# Altium footprint library Mine.PcbLib: 306 footprints (part 1 of 20)
Each footprint in its own frame and in the unit in brackets; x right, y up, seen from the top. Pads: shape width x height; smd on the part's side, far side on the other; paste and mask are expansions set on the pad; w line width, h text height; cw(c..) or ccw(c..) is an arc to the next point about the centre after c.
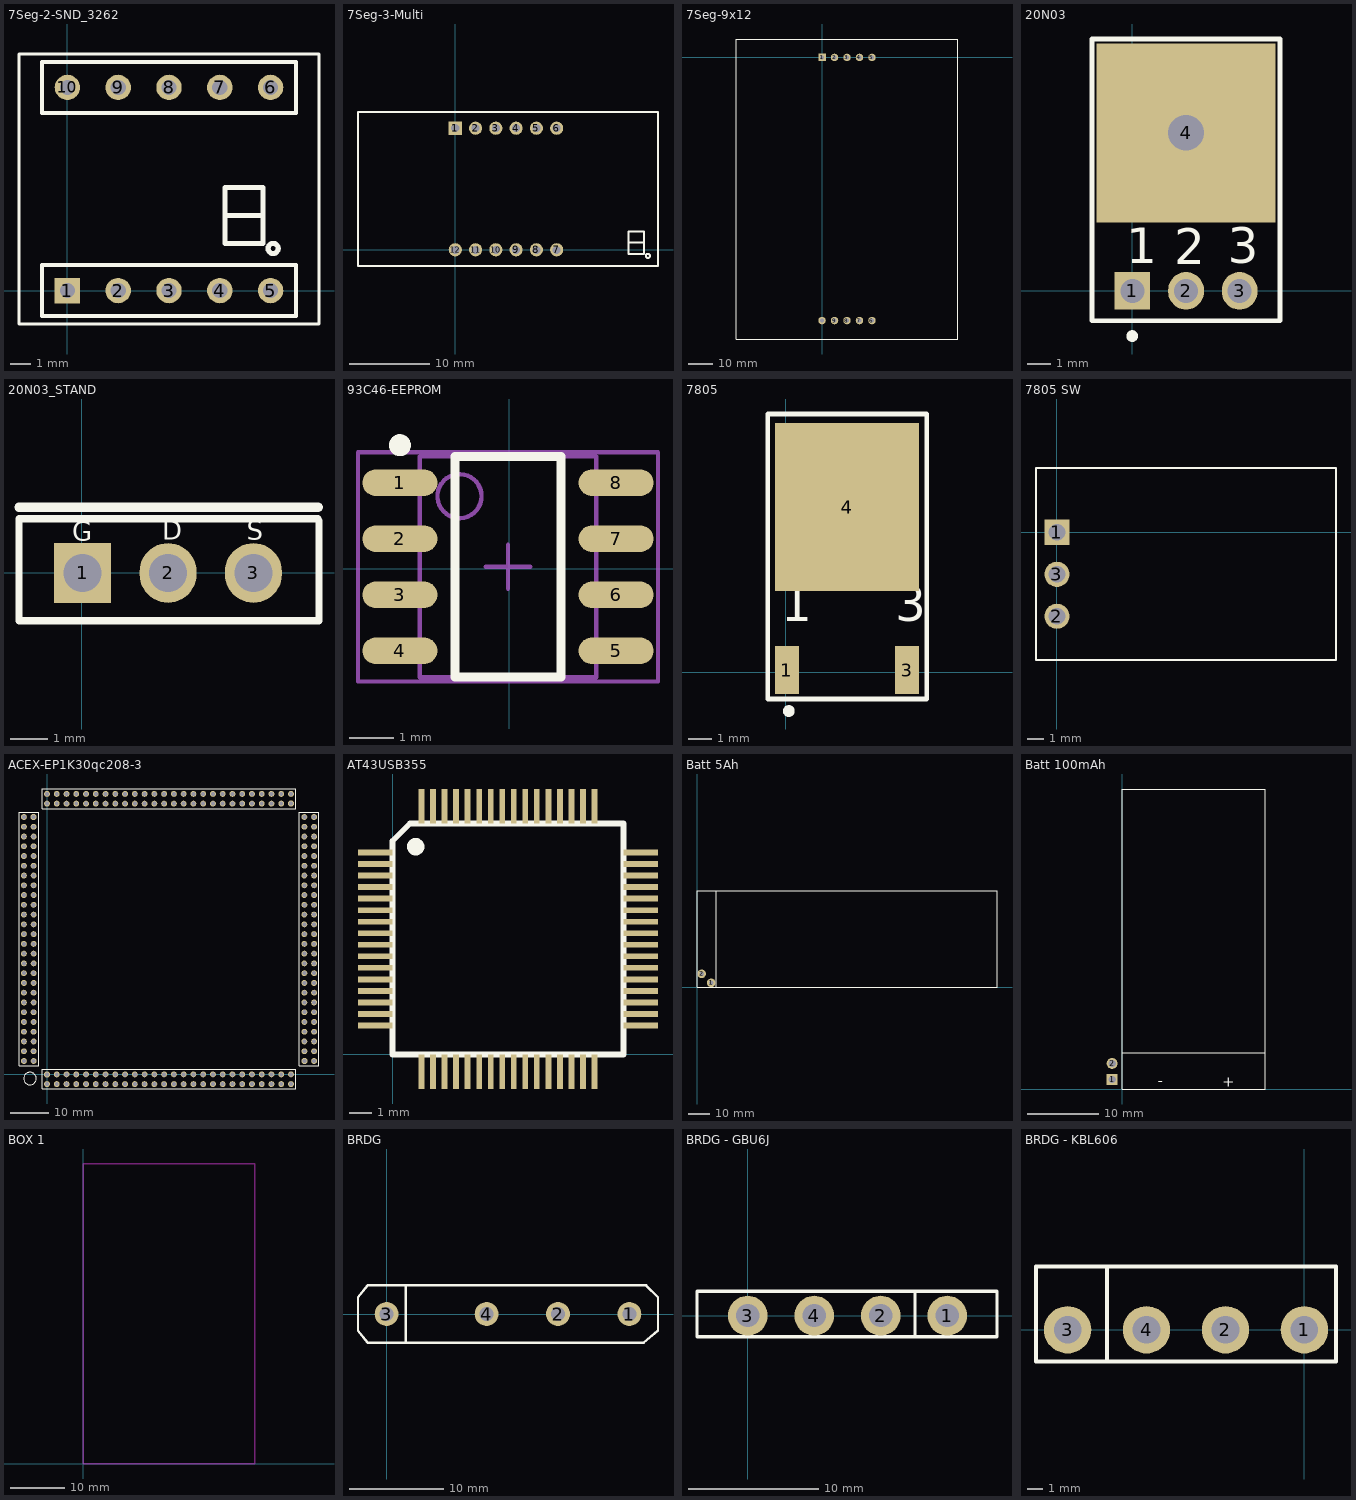
[diagram p0: the footprints below, top view; thin cyan lines are the x and y axes]

## 7Seg-2-SND_3262 [mil]
height 275.59
pads (10):
  rect 50x50 hole 30: 1(0,0)
  round 50 hole 30: 2(100,0) 3(200,0) 4(300,0) 5(400,0) 6(400,400) 7(300,400) 8(200,400) 9(100,400) 10(0,400)
Top Overlay:
  circle w10: c405,83 r10
  lines w5: -95.28,-65.75 -95.28,465.75 495.28,465.75 495.28,-65.75 -95.28,-65.75
  lines w7.87: -50,-50 450,-50 450,50 -50,50 -50,-50 ; -50,350 450,350 450,450 -50,450 -50,350
  lines w10: 310,148 380,148 ; 310,93 385,93 385,203 310,203 310,93

## 7Seg-3-Multi [mil]
height 393.7
pads (12):
  rect 65x65 hole 40: 1(0,600)
  round 65 hole 40: 2(100,600) 3(200,600) 4(300,600) 5(400,600) 6(500,600) 7(500,0) 8(400,0) 9(300,0) 10(200,0) 11(100,0) 12(0,0)
Top Overlay:
  circle w10: c950,-30 r10
  lines w10: 855,35 925,35 ; -480,-80 -480,680 1000,680 1000,-80 -480,-80 ; 855,-20 855,90 930,90 930,-20 855,-20
3D body: height 393.7, standoff 0, extent -480,-80 1000,680

## 7Seg-9x12 [mil]
height 590.55
pads (10):
  rect 120x120 hole 60: 1(0,0)
  round 120 hole 60: 2(200,0) 3(400,0) 4(600,0) 5(800,0) 6(800,-4212.6) 7(600,-4212.6) 8(400,-4212.6) 9(200,-4212.6) 10(0,-4212.6)
Top Overlay:
  lines w10: -1371.65,-4507.87 2171.65,-4507.87 2171.65,295.28 -1371.65,295.28 -1371.65,-4507.87

## 20N03 [mil]
height 275.59
pads (4):
  rect 60x62.99 hole 40: 1(0,0)
  oval 60x62.99 hole 40: 2(90,0) 3(179.92,0)
  rect 300x300 on Top hole 60: 4(90,265)
Top Overlay:
  circle w9.84: c-0.2,-75.79 r4.92
  lines w7.87: -67.52,-50.2 -67.52,422.24 247.44,422.24 247.44,-50.2 -67.52,-50.2
  text "1" at -10.04,46.26 h59.06
  text "3" at 160.35,46.26 h59.06
  text "2" at 70,45 h59.05

## 20N03_STAND [mil]
pads (3):
  rect 60x62.99 hole 40: 1(1,0)
  oval 60x62.99 hole 40: 2(91,0) 3(180.92,0)
Top Overlay:
  lines w7.87: -66,-50.2 -66,57 248.44,57 ; -65.52,-50.2 249.44,-50.2 ; 250,-50.2 250,55
  lines w10: -66,69 249,69
  text "G" at -10,34 h20
  text "S" at 174,35 h20
  text "D" at 85,35 h20

## 93C46-EEPROM [mm]
pads (8):
  oval 1.7x0.6 smd: 1(-2.475,1.956) 2(-2.475,0.686) 3(-2.475,-0.584) 4(-2.475,-1.854) 5(2.425,-1.854) 6(2.425,-0.584) 7(2.425,0.686) 8(2.425,1.956)
Top Overlay:
  circle w0.25: c-2.475,2.806 r0.125
  lines w0.2: -1.225,-2.449 1.175,-2.449 1.175,2.551 -1.225,2.551 -1.225,-2.449
Mechanical 13:
  circle w0.1: c-1.125,1.651 r0.5
  lines w0.1: -2.025,-2.449 1.975,-2.449 1.975,2.551 -2.025,2.551 -2.025,-2.449
Mechanical 15:
  lines w0.1: -0.525,0.051 0.475,0.051 ; -0.025,-0.449 -0.025,0.551 ; -3.425,-2.549 3.375,-2.549 3.375,2.651 -3.425,2.651 -3.425,-2.549
3D body: height 1.75, standoff 0, extent -2.025,-2.449 1.975,2.551

## 7805 [mil]
pads (3):
  rect 40x80 smd: 1(2,3.29) 3(202,3.29)
  rect 240x280 smd: 4(102,274.71)
Top Overlay:
  circle w9.84: c5.08,-65 r4.92
  lines w7.87: -30,-45 235,-45 235,430 -30,430 -30,-45
  text "1" at -7.84,84.98 h59.06
  text "3" at 182,84.98 h59.06

## 7805 SW [mil]
height 400
pads (3):
  rect 60x60 hole 40: 1(0,0)
  round 60 hole 40: 2(0,-200) 3(0,-100)
Top Overlay:
  lines w5: -50,-304 -50,153 665,153 665,-304 -50,-304

## ACEX-EP1K30qc208-3 [mil]
height 196.85
pads (208):
  oct 60x60 hole 40: 1(0,0) 53(2637.01,137.01) 105(2500,2774.02) 157(-137.01,2637.01)
  round 60 hole 40: 2(0,-100) 3(100,0) 4(100,-100) 5(200,0) 6(200,-100) 7(300,0) 8(300,-100) 9(400,0) 10(400,-100) 11(500,0) 12(500,-100) 13(600,0) 14(600,-100) 15(700,0) 16(700,-100) 17(800,0) 18(800,-100) 19(900,0) 20(900,-100) 21(1000,0) 22(1000,-100) 23(1100,0) 24(1100,-100) 25(1200,0) 26(1200,-100) 27(1300,0) 28(1300,-100) 29(1400,0) 30(1400,-100) 31(1500,0) 32(1500,-100) 33(1600,0) 34(1600,-100) 35(1700,0) 36(1700,-100) 37(1800,0) 38(1800,-100) 39(1900,0) 40(1900,-100) 41(2000,0) 42(2000,-100) 43(2100,0) 44(2100,-100) 45(2200,0) 46(2200,-100) 47(2300,0) 48(2300,-100) 49(2400,0) 50(2400,-100) 51(2500,0) 52(2500,-100) 54(2737.01,137.01) 55(2637.01,237.01) 56(2737.01,237.01) 57(2637.01,337.01) 58(2737.01,337.01) 59(2637.01,437.01) 60(2737.01,437.01) 61(2637.01,537.01) 62(2737.01,537.01) 63(2637.01,637.01) 64(2737.01,637.01) 65(2637.01,737.01) 66(2737.01,737.01) 67(2637.01,837.01) 68(2737.01,837.01) 69(2637.01,937.01) 70(2737.01,937.01) 71(2637.01,1037.01) 72(2737.01,1037.01) 73(2637.01,1137.01) 74(2737.01,1137.01) 75(2637.01,1237.01) 76(2737.01,1237.01) 77(2637.01,1337.01) 78(2737.01,1337.01) 79(2637.01,1437.01) 80(2737.01,1437.01) 81(2637.01,1537.01) 82(2737.01,1537.01) 83(2637.01,1637.01) 84(2737.01,1637.01) 85(2637.01,1737.01) 86(2737.01,1737.01) 87(2637.01,1837.01) 88(2737.01,1837.01) 89(2637.01,1937.01) 90(2737.01,1937.01) 91(2637.01,2037.01) 92(2737.01,2037.01) 93(2637.01,2137.01) 94(2737.01,2137.01) 95(2637.01,2237.01) 96(2737.01,2237.01) 97(2637.01,2337.01) 98(2737.01,2337.01) 99(2637.01,2437.01) 100(2737.01,2437.01) 101(2637.01,2537.01) 102(2737.01,2537.01) 103(2637.01,2637.01) 104(2737.01,2637.01) 106(2500,2874.02) 107(2400,2774.02) 108(2400,2874.02) 109(2300,2774.02) 110(2300,2874.02) 111(2200,2774.02) 112(2200,2874.02) 113(2100,2774.02) 114(2100,2874.02) 115(2000,2774.02) 116(2000,2874.02) 117(1900,2774.02) 118(1900,2874.02) 119(1800,2774.02) 120(1800,2874.02) 121(1700,2774.02) 122(1700,2874.02) 123(1600,2774.02) 124(1600,2874.02) 125(1500,2774.02) 126(1500,2874.02) 127(1400,2774.02) 128(1400,2874.02) 129(1300,2774.02) 130(1300,2874.02) 131(1200,2774.02) 132(1200,2874.02) 133(1100,2774.02) 134(1100,2874.02) 135(1000,2774.02) 136(1000,2874.02) 137(900,2774.02) 138(900,2874.02) 139(800,2774.02) 140(800,2874.02) 141(700,2774.02) 142(700,2874.02) 143(600,2774.02) 144(600,2874.02) 145(500,2774.02) 146(500,2874.02) 147(400,2774.02) 148(400,2874.02) 149(300,2774.02) 150(300,2874.02) 151(200,2774.02) 152(200,2874.02) 153(100,2774.02) 154(100,2874.02) 155(0,2774.02) 156(0,2874.02) 158(-237.01,2637.01) 159(-137.01,2537.01) 160(-237.01,2537.01) 161(-137.01,2437.01) 162(-237.01,2437.01) 163(-137.01,2337.01) 164(-237.01,2337.01) 165(-137.01,2237.01) 166(-237.01,2237.01) 167(-137.01,2137.01) 168(-237.01,2137.01) 169(-137.01,2037.01) 170(-237.01,2037.01) 171(-137.01,1937.01) 172(-237.01,1937.01) 173(-137.01,1837.01) 174(-237.01,1837.01) 175(-137.01,1737.01) 176(-237.01,1737.01) 177(-137.01,1637.01) 178(-237.01,1637.01) 179(-137.01,1537.01) 180(-237.01,1537.01) 181(-137.01,1437.01) 182(-237.01,1437.01) 183(-137.01,1337.01) 184(-237.01,1337.01) 185(-137.01,1237.01) 186(-237.01,1237.01) 187(-137.01,1137.01) 188(-237.01,1137.01) 189(-137.01,1037.01) 190(-237.01,1037.01) 191(-137.01,937.01) 192(-237.01,937.01) 193(-137.01,837.01) 194(-237.01,837.01) 195(-137.01,737.01) 196(-237.01,737.01) 197(-137.01,637.01) 198(-237.01,637.01) 199(-137.01,537.01) 200(-237.01,537.01) 201(-137.01,437.01) 202(-237.01,437.01) 203(-137.01,337.01) 204(-237.01,337.01) 205(-137.01,237.01) 206(-237.01,237.01) 207(-137.01,137.01) 208(-237.01,137.01)
Top Overlay:
  circle w10: c-174.61,-43 r64.46
  lines w7.87: -287.01,87.01 -287.01,2687.01 -87.01,2687.01 -87.01,87.01 -287.01,87.01 ; -50,-150 2550,-150 2550,50 -50,50 -50,-150 ; -50,2724.02 -50,2924.02 2550,2924.02 2550,2724.02 -50,2724.02 ; 2587.01,87.01 2787.01,87.01 2787.01,2687.01 2587.01,2687.01 2587.01,87.01

## AT43USB355 [mil]
pads (64):
  rect 60x10 smd: 1(-30,350) 2(-30,330) 3(-30,310) 4(-30,290) 5(-30,270) 6(-30,250) 7(-30,230) 8(-30,210) 9(-30,190) 10(-30,170) 11(-30,150) 12(-30,130) 13(-30,110) 14(-30,90) 15(-30,70) 16(-30,50) 33(430,50) 34(430,70) 35(430,90) 36(430,110) 37(430,130) 38(430,150) 39(430,170) 40(430,190) 41(430,210) 42(430,230) 43(430,250) 44(430,270) 45(430,290) 46(430,310) 47(430,330) 48(430,350)
  rect 10x60 smd: 17(50,-30) 18(70,-30) 19(90,-30) 20(110,-30) 21(130,-30) 22(150,-30) 23(170,-30) 24(190,-30) 25(210,-30) 26(230,-30) 27(250,-30) 28(270,-30) 29(290,-30) 30(310,-30) 31(330,-30) 32(350,-30) 49(350,430) 50(330,430) 51(310,430) 52(290,430) 53(270,430) 54(250,430) 55(230,430) 56(210,430) 57(190,430) 58(170,430) 59(150,430) 60(130,430) 61(110,430) 62(90,430) 63(70,430) 64(50,430)
Top Overlay:
  circle w20: c40,360 r5
  lines w10: 0,0 400,0 400,400 30,400 0,370 0,0

## Batt 5Ah [mm]
height 7
pads (2):
  round 4 hole 2: 1(6.604,2.032) 2(2.159,6.223)
Top Overlay:
  lines w0.254: 9.017,0 9.017,45.085 ; 0,0 0,45 140,45 140,0 0,0
Multi-Layer:
  lines w0.254: 75.946,-0.127 76.2,0.127

## Batt 100mAh [mil]
height 236.22
pads (2):
  rect 60x60 hole 40: 1(-57,53)
  round 60 hole 40: 2(-57,141)
Top Overlay:
  lines w5: 0,200 787.4,200 ; 0,0 787.4,0 787.4,1653.54 0,1653.54 0,0
  text "+" at 550,13 h60
  text "-" at 195,18 h60

## BOX 1 [mil] "31.5 X 55 mm"
height 433.07
Keep-Out Layer:
  lines w10: 0,0 0,2165.35 1240.16,2165.35 1240.16,0 0,0

## BRDG [mil]
pads (4):
  round 100 hole 60: 1(1020,0) 2(720,0) 3(0,0) 4(420,0)
Top Overlay:
  lines w10: 80,-120 80,120 ; -120,-70 -80,-120 1080,-120 1140,-70 1140,70 1090,120 -80,120 -120,70 -120,-70

## BRDG - GBU6J [mil]
height 807.09
pads (4):
  round 120 hole 70: 1(602.36,0) 2(401.57,0) 3(0,0) 4(200.79,0)
Top Overlay:
  lines w10: 505,-64 505,73.8 ; -153.07,-64 -153.07,73.8 752.44,73.8 752.44,-64 -153.07,-64

## BRDG - KBL606 [mil]
pads (4):
  round 120 hole 70: 1(0,0) 2(-200,0) 3(-600,0) 4(-400,0)
Top Overlay:
  lines w10: -500,-80 -500,160 ; -680,-80 -680,160 80,160 80,-80 -680,-80